# Altium footprint library RES_0603.PcbLib: 1 footprints
Each footprint in its own frame and in the unit in brackets; x right, y up, seen from the top. Pads: shape width x height; smd on the part's side, far side on the other; paste and mask are expansions set on the pad; w line width, h text height; cw(c..) or ccw(c..) is an arc to the next point about the centre after c.
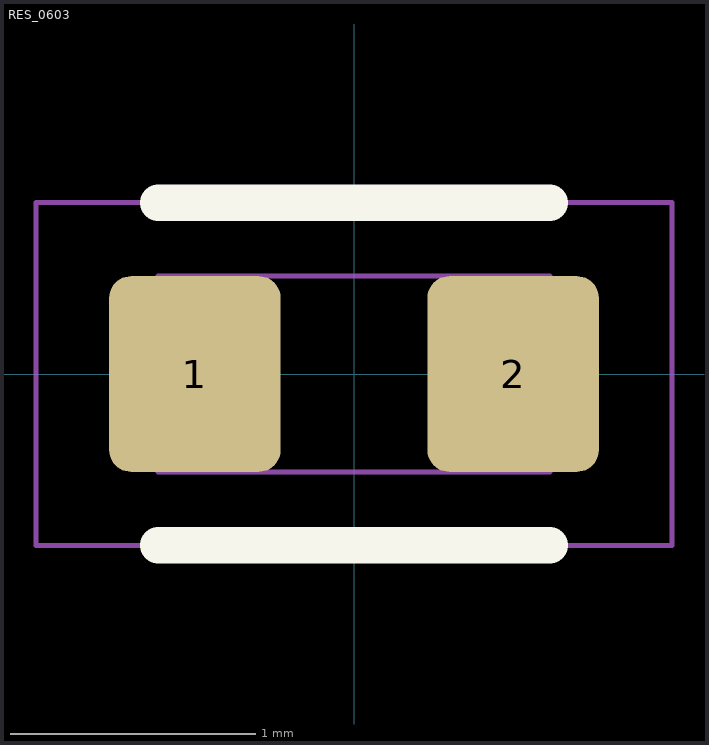
[diagram p0: the footprint, top view; thin cyan lines are the x and y axes]

## RES_0603 [mm] "Chip Resistor, 2-Leads, Body 1,5x0,8mm"
height 0.6
pads (2):
  rrect25% 0.7x0.8 smd paste+0 mask+0.075: 1(-0.65,0) 2(0.65,0)
Top Overlay:
  lines w0.15: -0.8,-0.7 0.8,-0.7 ; -0.8,0.7 0.8,0.7
Mechanical 9:
  text "'.PN'" at -0.916,-0.292 h0.5
Mechanical 15:
  lines w0.02: -1.3,-0.7 1.3,-0.7 1.3,0.7 -1.3,0.7 -1.3,-0.7
Mechanical 17:
  lines w0.02: -0.8,-0.4 -0.8,0.4 0.8,0.4 0.8,-0.4 -0.8,-0.4
3D body: height 0.01, standoff 0, extent 0.3,-0.4 1,0.4
3D body: height 0.01, standoff 0, extent -1,-0.4 -0.3,0.4
3D body "ERA-3ARB152V.stp": height 0.45, standoff 0, extent -0.8,-0.4 0.8,0.4